# Altium footprint library 2.52-直插元件.PcbLib: 165 footprints (part 10 of 11)
Each footprint in its own frame and in the unit in brackets; x right, y up, seen from the top. Pads: shape width x height; smd on the part's side, far side on the other; paste and mask are expansions set on the pad; w line width, h text height; cw(c..) or ccw(c..) is an arc to the next point about the centre after c.
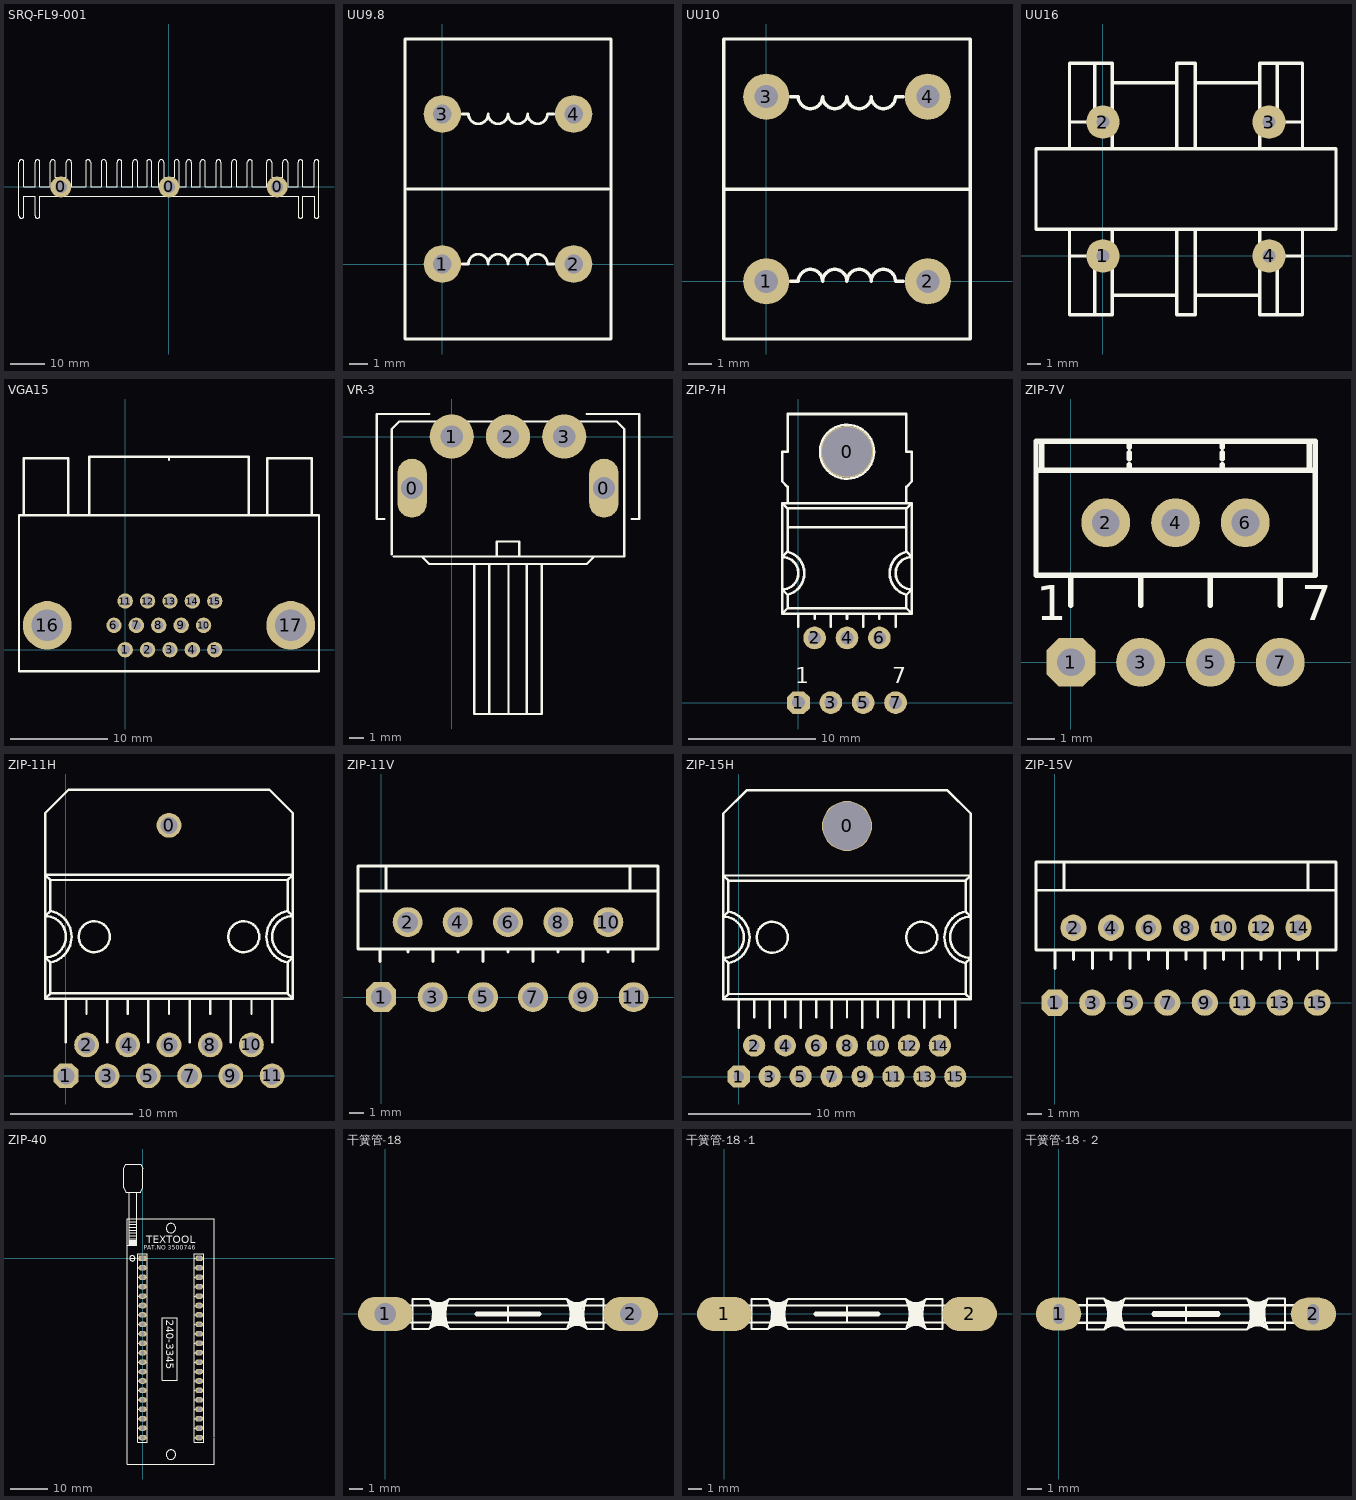
[diagram p9: the footprints below, top view; thin cyan lines are the x and y axes]

## SRQ-FL9-001 [mm] "封装库来自淘宝卖家 ID：黄晶宝石"
pads (3):
  round 6 hole 3.5: 0(-31,0) 0(0,0) 0(31,0)
Top Overlay:
  lines w0.1: -31.827,0.937 ccw(c-31,0) -30.172,0.937 ; -31.8,0.937 -31.8,2.8 -32.6,2.8 -32.6,7.1 ccw(c-33.3,7.1) -34,7.1 -34,0 -37,0 -37,7.1 ccw(c-37.7,7.1) -38.4,7.1 -38.4,0 -41.6,0 -41.6,7.1 ccw(c-42.3,7.1) -43,7.1 -43,-8.3 ccw(c-42.3,-8.3) -41.6,-8.3 -41.6,-2.7 -38.4,-2.7 -38.4,-8.3 ccw(c-37.7,-8.3) -37,-8.3 -37,-2.7 37,-2.7 37,-8.3 ccw(c37.7,-8.3) 38.4,-8.3 38.4,-2.7 41.6,-2.7 41.6,-8.3 ccw(c42.3,-8.3) 43,-8.3 43,7.1 ccw(c42.3,7.1) 41.6,7.1 41.6,0 38.4,0 38.4,7.1 ccw(c37.7,7.1) 37,7.1 37,0 34,0 34,7.1 ccw(c33.3,7.1) 32.6,7.1 32.6,2.8 31.8,2.8 31.8,0.937 ; -30.2,0.937 -30.2,2.8 -29.4,2.8 -29.4,7.1 cw(c-28.7,7.1) -28,7.1 -28,0 -23.9,0 -23.9,7.1 cw(c-23.2,7.1) -22.5,7.1 -22.5,0 -19.4,0 -19.4,7.1 cw(c-18.7,7.1) -18,7.1 -18,0 -14.9,0 -14.9,7.1 cw(c-14.2,7.1) -13.5,7.1 -13.5,0 -10.4,0 -10.4,7.1 cw(c-9.7,7.1) -9,7.1 -9,0 -6.4,0 -6.4,7.1 cw(c-5.7,7.1) -5,7.1 -5,0 -2.9,0 -2.9,7.1 cw(c-2.2,7.1) -1.5,7.1 -1.5,2.8 -0.827,2.8 -0.827,0.937 ccw(c0,0) 0.828,0.937 0.828,2.8 1.5,2.8 1.5,7.1 cw(c2.2,7.1) 2.9,7.1 2.9,0 5,0 5,7.1 cw(c5.7,7.1) 6.4,7.1 ; 6.4,7.1 6.4,0 9,0 9,7.1 cw(c9.7,7.1) 10.4,7.1 10.4,0 13.5,0 13.5,7.1 cw(c14.2,7.1) 14.9,7.1 14.9,0 18,0 18,7.1 cw(c18.7,7.1) 19.4,7.1 19.4,0 22.5,0 22.5,7.1 cw(c23.2,7.1) 23.9,7.1 23.9,0 28,0 28,7.1 cw(c28.7,7.1) 29.4,7.1 29.4,2.8 30.2,2.8 30.2,0.937 ; 30.173,0.937 ccw(c31,0) 31.828,0.937
3D body: height 33, standoff 0, extent -43,-9 43,7.8

## UU9.8 [mm]
pads (4):
  round 2 hole 1: 1(0,0) 2(7,0) 3(0,8) 4(7,8)
Top Overlay:
  lines w0.15: -2,-4 9,-4 ; -2,-3.991 -2,12 9,12 9,-3.991 ; -1.851,3.998 8.847,3.998 ; 1.045,-0.007 1.388,-0.007 cw(c1.915,-0.007) 2.442,-0.007 cw(c2.969,-0.007) 3.496,-0.007 cw(c4.023,-0.007) 4.55,-0.007 cw(c5.077,-0.007) 5.604,-0.007 5.947,-0.007 ; 1.045,8.007 1.388,8.007 ccw(c1.915,8.007) 2.442,8.007 ccw(c2.969,8.007) 3.496,8.007 ccw(c4.023,8.007) 4.55,8.007 ccw(c5.077,8.007) 5.604,8.007 5.947,8.007
3D body: height 16.04, standoff -2.96, extent -1.75,-3.746 8.75,11.755

## UU10 [mm] "淘宝ID:黄晶宝石   店铺网址:https://shop463601444.taobao.com"
pads (4):
  round 2 hole 1: 1(0,0) 2(7,0) 3(0,8) 4(7,8)
Top Overlay:
  lines w0.15: -1.851,3.998 8.847,3.998 ; -1.851,10.5 -1.847,-2.5 8.847,-2.5 8.847,10.5 -1.847,10.5 ; 1.045,-0.007 1.388,-0.007 cw(c1.915,-0.007) 2.442,-0.007 cw(c2.969,-0.007) 3.496,-0.007 cw(c4.023,-0.007) 4.55,-0.007 cw(c5.077,-0.007) 5.604,-0.007 5.947,-0.007 ; 1.045,8.007 1.388,8.007 ccw(c1.915,8.007) 2.442,8.007 ccw(c2.969,8.007) 3.496,8.007 ccw(c4.023,8.007) 4.55,8.007 ccw(c5.077,8.007) 5.604,8.007 5.947,8.007
3D body: height 15.45, standoff -3, extent -1.925,-3.782 8.925,11.782

## UU16 [mm] "封装库来自淘宝卖家 ID：黄晶宝石"
pads (4):
  round 2.5 hole 1: 1(0,0) 2(0,10) 3(12.4,10) 4(12.4,0)
Top Overlay:
  lines w0.254: -2.5,8 -2.5,9.996 ; 0.7,-2.923 5.5,-2.923 ; 0.7,2 0.7,-4.4 -0.6,-4.4 ; 0.7,8 0.7,14.4 -0.6,14.4 ; 0.7,12.923 5.5,12.923 ; 5.5,2 5.5,-4.4 6.9,-4.4 6.9,2 ; 5.5,8 5.5,14.4 6.9,14.4 6.9,8 ; 6.9,-2.923 11.7,-2.923 ; 6.9,12.923 11.7,12.923 ; 11.7,2 11.7,-4.4 13,-4.4 ; 11.7,8 11.7,14.4 13,14.4 ; -2.5,0 -2.5,0.004 ; -2.5,0 -0.6,0 -0.6,-4.4 ; -2.5,0 -2.5,0.004 ; -2.5,0 -2.5,2 -2.5,0.004 ; -2.5,0.004 -2.5,-4.4 -0.6,-4.4 ; -2.5,9.996 -2.5,14.4 -0.6,14.4 ; -2.5,9.996 -2.5,10 -0.6,10 -0.6,14.4 ; 13,-4.4 14.9,-4.4 14.9,0.004 ; 13,-4.4 13,0 14.9,0 ; 13,14.4 14.9,14.4 14.9,9.996 ; 13,14.4 13,10 14.9,10 ; 14.9,0 14.9,0.004 ; 14.9,0 14.9,0.004 ; 14.9,0 14.9,2 14.9,0.004 ; 14.9,9.996 14.9,10 ; 14.9,9.996 14.9,8 14.9,10 ; 14.9,9.996 14.9,10 ; -5,2 17.4,2 17.4,8 -5,8 -5,2
3D body: height 25.55, standoff -3.8, extent -4.917,-4.35 17.317,14.35

## VGA15 [mm]
pads (17):
  round 1.58 hole 1: 1(0,0) 2(2.3,0) 3(4.6,0) 4(6.9,0) 5(9.2,0) 6(-1.15,2.5) 7(1.15,2.5) 8(3.45,2.5) 9(5.75,2.5) 10(8.05,2.5) 11(0,5) 12(2.3,5) 13(4.6,5) 14(6.9,5) 15(9.2,5)
  round 5 hole 3.25: 16(-8,2.5) 17(17,2.5)
Top Overlay:
  lines w0.254: -10.9,-2.2 -10.9,13.8 19.9,13.8 19.9,-2.2 -10.89,-2.2 -10.9,-2.19 ; -10.4,13.8 -10.4,19.67 -5.83,19.67 -5.83,13.82 ; -3.7,13.8 -3.7,19.8 12.7,19.8 12.7,13.8 ; 4.5,19.5 4.5,19.8 ; 14.6,13.8 14.6,19.68 19.18,19.68 19.18,13.84
3D body: height 12.77, standoff -3.27, extent -11.055,-0.875 19.755,20.225

## VR-3 [mm]
pads (5):
  oval 2x4 hole 1.5: 0(-2.69,-3.5) 0(10.31,-3.5)
  round 3 hole 1.5: 1(0,0) 2(3.81,0) 3(7.62,0)
Top Overlay:
  lines w0.15: -4.572,-5.588 -5.08,-5.588 -5.08,1.524 -2.54,1.524 ; -4.572,1.524 -1.524,1.524 ; -4.064,-8 -4.064,0.508 -3.556,1.016 11.176,1.016 11.684,0.508 11.684,-8.128 -3.936,-8.128 ; -2.032,-8.128 -1.524,-8.636 9.144,-8.636 9.652,-8.128 ; 1.524,-8.636 1.524,-18.796 6.096,-18.796 6.096,-8.636 ; 2.54,-18.796 2.54,-8.636 ; 3.048,-8.128 3.048,-7.112 4.572,-7.112 4.572,-8.128 ; 3.85,-18.796 3.85,-8.636 ; 5.08,-18.796 5.08,-8.636 ; 9.144,1.524 12.7,1.524 12.7,-5.588 12.192,-5.588
Keep-Out Layer:
  lines w0.15: -2.692,-4.521 -2.692,-2.489 ; 10.308,-4.521 10.308,-2.489
3D body: height 30, standoff -5, extent -6.29,-16.653 11.71,4.347

## ZIP-7H [mil]
pads (8):
  round 161.65 hole 154.17: 0(150,775)
  oct 70x70 hole 40: 1(0,0)
  round 70 hole 40: 2(50,200) 3(100,0) 4(150,200) 5(200,0) 6(250,200) 7(300,0)
Top Overlay:
  circle w8: c150,775 r83.33
  lines w7.87: -50,350 -33.33,333.33 -33.33,291.67 ; -50,450 -33.33,466.67 -33.33,600 ; -33.33,541.67 333.33,541.67 ; -33.33,616.67 -33.33,666.67 -50,683.33 -50,775 -33.33,775 -33.33,891.67 333.33,891.67 333.33,775 350,775 350,683.33 333.33,666.67 333.33,616.67 ; 0,234.46 0,275 ; 50,259.06 50,275 ; 100,234.25 100,275 ; 150,259.06 150,275 ; 200,234.25 200,275 ; 250,259.06 250,275 ; 300,234.25 300,275 ; 350,350 333.33,333.33 333.33,291.67 ; 350,450 333.33,466.67 333.33,600 ; -50,275 -33.33,291.67 ; -50,275 -50,616.67 ; -50,275 350,275 ; -50,616.67 -33.33,600 ; -50,616.67 350,616.67 ; -33.33,291.67 333.33,291.67 ; -33.33,600 333.33,600 ; 333.33,291.67 350,275 ; 333.33,600 350,616.67 ; 350,275 350,616.67
  lines w8: -50,350 ccw(c-50,400) -50,450 ; -33.47,333.7 ccw(c-50,400) -33.47,466.3 ; 333.47,333.7 cw(c350,400) 333.47,466.3 ; 350,350 cw(c350,400) 350,450
  text "7" at 290,60 h50
  text "1" at -10,60 h50

## ZIP-7V [mil]
pads (7):
  oct 70x70 hole 40: 1(0,0)
  round 70 hole 40: 2(50,200) 3(100,0) 4(150,200) 5(200,0) 6(250,200) 7(300,0)
Top Overlay:
  lines w7.87: -50,275 350,275 ; -41.67,275 -41.67,316.67 ; 0,81.89 0,125 ; 83.33,275 83.33,283.33 ; 83.33,291.67 83.33,300 ; 83.33,308.33 83.33,316.67 ; 100,81.89 100,125 ; 200,81.89 200,125 ; 216.67,275 216.67,283.33 ; 216.67,291.67 216.67,300 ; 216.67,308.33 216.67,316.67 ; 300,81.89 300,125 ; 341.67,275 341.67,316.67 ; -50,125 -50,316.67 350,316.67 350,125 -50,125
  text "1" at -50,60 h50
  text "7" at 330,60 h50

## ZIP-11H [mil]
pads (12):
  round 80 hole 55: 0(333.33,810) 2(66.67,100) 3(133.33,0) 4(200,100) 5(266.67,0) 6(333.33,100) 7(400,0) 8(466.67,100) 9(533.33,0) 10(600,100) 11(666.67,0)
  oct 80x80 hole 55: 1(0,0)
Top Overlay:
  circle w8: c575,450 r50
  circle w8: c91.67,450 r50
  lines w7.87: -66.67,383.33 -50,366.67 -50,266.67 ; -66.67,516.67 -50,533.33 -50,633.33 ; 0,108.33 0,250 ; 66.67,200 66.67,250 ; 133.33,108.33 133.33,250 ; 200,200 200,250 ; 266.67,108.33 266.67,250 ; 333.33,200 333.33,250 ; 400,108.33 400,250 ; 466.67,200 466.67,250 ; 533.33,108.33 533.33,250 ; 600,200 600,250 ; 666.67,108.33 666.67,250 ; 733.33,383.33 716.67,366.67 716.67,266.67 ; 733.33,516.67 716.67,533.33 716.67,633.33 ; -66.67,250 -50,266.67 ; -66.67,250 733.33,250 ; -66.67,250 -66.67,650 ; -66.67,650 -50,633.33 ; -66.67,650 733.33,650 ; -66.67,650 -66.67,850 8.33,925 658.33,925 733.33,850 733.33,650 ; -50,266.67 716.67,266.67 ; -50,633.33 716.67,633.33 ; 716.67,266.67 733.33,250 ; 716.67,633.33 733.33,650 ; 733.33,250 733.33,650
  lines w8: -66.67,383.33 ccw(c-66.67,450) -66.67,516.67 ; -50.45,366.56 ccw(c-66.67,450) -50.45,533.44 ; 717.11,366.56 cw(c733.33,450) 717.11,533.44 ; 733.33,383.33 cw(c733.33,450) 733.33,516.67

## ZIP-11V [mil]
pads (11):
  oct 80x80 hole 55: 1(0,0)
  round 80 hole 55: 2(70.83,200) 3(137.5,0) 4(204.17,200) 5(271.67,0) 6(338.33,200) 7(405,0) 8(472.5,200) 9(539.17,0) 10(605.83,200) 11(673.33,0)
Top Overlay:
  lines w7.87: -3.33,94.89 -3.33,128.23 ; 13.33,283.33 13.33,350 ; 71.67,119.89 71.67,128.23 ; 138.33,94.89 138.33,128.23 ; 205,119.89 205,128.23 ; 271.67,94.89 271.67,128.23 ; 338.33,119.89 338.33,128.23 ; 405,94.89 405,128.23 ; 471.67,119.89 471.67,128.23 ; 538.33,94.89 538.33,128.23 ; 605,119.89 605,128.23 ; 663.33,283.33 663.33,350 ; 671.67,94.89 671.67,128.23 ; -61.67,283.33 -61.67,128.23 738.33,128.23 738.33,283.33 ; -61.67,283.33 738.33,283.33 ; -61.67,283.33 -61.67,350 738.33,350 738.33,283.33

## ZIP-15H [mil]
pads (16):
  round 161.67 hole 154.17: 0(350,810)
  oct 71.67x71.67 hole 35: 1(0,0)
  round 71.67 hole 35: 2(50,100) 3(100,0) 5(200,0) 6(250,100) 7(300,0) 8(350,100) 9(400,0) 10(450,100) 11(500,0) 12(550,100) 13(600,0) 14(650,100) 15(700,0)
  round 70 hole 40: 4(150,100)
Top Overlay:
  circle w8: c108.33,450 r50
  circle w8: c591.67,450 r50
  lines w7.87: -50,383.33 -33.33,366.67 -33.33,266.67 ; -50,516.67 -33.33,533.33 -33.33,633.33 ; 0,157.48 0,250 ; 50,191.67 50,250 ; 100,157.48 100,250 ; 150,191.67 150,250 ; 200,157.48 200,250 ; 250,191.67 250,250 ; 300,157.48 300,250 ; 350,191.67 350,250 ; 400,157.48 400,250 ; 450,191.67 450,250 ; 500,157.48 500,250 ; 550,191.67 550,250 ; 600,157.48 600,250 ; 650,191.67 650,250 ; 700,157.48 700,250 ; 750,383.33 733.33,366.67 733.33,266.67 ; 750,516.67 733.33,533.33 733.33,633.33 ; -50,250 -50,650 ; -50,250 750,250 ; -50,250 -33.33,266.67 ; -50,650 -50,850 25,925 675,925 750,850 750,650 ; -50,650 750,650 ; -50,650 -33.33,633.33 ; -33.33,266.67 733.33,266.67 ; -33.33,633.33 733.33,633.33 ; 733.33,266.67 750,250 ; 733.33,633.33 750,650 ; 750,250 750,650
  lines w8: -50,383.33 ccw(c-50,450) -50,516.67 ; -33.78,366.56 ccw(c-50,450) -33.78,533.44 ; 733.78,366.56 cw(c750,450) 733.78,533.44 ; 750,383.33 cw(c750,450) 750,516.67

## ZIP-15V [mil] "淘宝ID:黄晶宝石"
pads (15):
  oct 70x70 hole 40: 1(0,0)
  round 70 hole 40: 2(50,200) 3(100,0) 4(150,200) 5(200,0) 6(250,200) 7(300,0) 8(350,200) 9(400,0) 10(450,200) 11(500,0) 12(550,200) 13(600,0) 14(650,200) 15(700,0)
Top Overlay:
  lines w7.87: -50.16,140.91 -50,283.33 -50,375 750,375 750,300 ; -50,140.91 750,140.91 750,300 ; -50,300 750,300 ; 0,90.91 0,140.91 ; 25,300 25,375 ; 50,115.91 50,140.91 ; 100,90.91 100,140.91 ; 150,115.91 150,140.91 ; 200,90.91 200,140.91 ; 250,115.91 250,140.91 ; 300,90.91 300,140.91 ; 350,115.91 350,140.91 ; 400,90.91 400,140.91 ; 450,115.91 450,140.91 ; 500,90.91 500,140.91 ; 550,115.91 550,140.91 ; 600,90.91 600,140.91 ; 650,115.91 650,140.91 ; 675,300 675,375 ; 700,90.91 700,140.91

## ZIP-40 [mil]
pads (40):
  rect 85x59.06 hole 45: 1(0,0)
  oval 85x59.06 hole 45: 2(0,-100) 3(0,-200) 4(0,-300) 5(0,-400) 6(0,-500) 7(0,-600) 8(0,-700) 9(0,-800) 10(0,-900) 11(0,-1000) 12(0,-1100) 13(0,-1200) 14(0,-1300) 15(0,-1400) 16(0,-1500) 17(0,-1600) 18(0,-1700) 19(0,-1800) 20(0,-1900) 21(600,-1900) 22(600,-1800) 23(600,-1700) 24(600,-1600) 25(600,-1500) 26(600,-1400) 27(600,-1300) 28(600,-1200) 29(600,-1100) 30(600,-1000) 31(600,-900) 32(600,-800) 33(600,-700) 34(600,-600) 35(600,-500) 36(600,-400) 37(600,-300) 38(600,-200) 39(600,-100) 40(600,0)
Top Overlay:
  circle w7: c-108.28,0 r28.28
  circle w7: c300,320 r50
  circle w7: c300,-2080 r50
  lines w10: -160,140 -60,140 -60,420 -60,700 ; -140,140 -140,190 -60,190 ; -140,160 -60,160 ; -140,170 -60,170 ; -140,180 -60,180 ; -140,210 -60,210 ; -140,240 -60,240 ; -140,270 -60,270 ; -140,300 -60,300 ; -140,330 -60,330 ; -140,360 -60,360 ; -140,390 -60,390 ; -130,0 -80,0 ; -60,150 -140,150 -140,420 -140,700 ; -50,-1900 50,-1900 ; -50,-1800 50,-1800 ; -50,-1700 50,-1700 ; -50,-1600 50,-1600 ; -50,-1500 50,-1500 ; -50,-1400 50,-1400 ; -50,-1300 50,-1300 ; -50,-1200 50,-1200 ; -50,-1100 50,-1100 ; -50,-1000 50,-1000 ; -50,-900 50,-900 ; -50,-800 50,-800 ; -50,-700 50,-700 ; -50,-600 50,-600 ; -50,-500 50,-500 ; -50,-400 50,-400 ; -50,-300 50,-300 50,-320 ; -50,-200 50,-200 ; -50,-100 50,-100 ; -50,0 50,0 ; 550,-1900 650,-1900 ; 550,-1800 650,-1800 ; 550,-1700 650,-1700 ; 550,-1600 650,-1600 ; 550,-1500 650,-1500 ; 550,-1400 650,-1400 ; 550,-1300 650,-1300 ; 550,-1200 650,-1200 ; 550,-1100 650,-1100 ; 550,-1000 650,-1000 ; 550,-900 650,-900 ; 550,-800 650,-800 ; 550,-700 650,-700 ; 550,-600 650,-600 ; 550,-500 640,-500 650,-500 ; 550,-400 650,-400 ; 550,-300 650,-300 ; 550,-200 650,-200 ; 550,-100 650,-100 ; 550,0 650,0 ; 760,-1900 760,-2180 -160,-2180 -160,420 760,420 760,-1890 ; -140,700 -180,700 -200,750 -200,950 -180,1000 -20,1000 0,950 0,750 -20,700 -60,700 ; -140,700 -60,700 ; -50,-1950 -50,50 50,50 50,-1950 -50,-1950 ; 210,-1290 370,-1290 370,-630 210,-630 210,-1290 ; 550,-1950 550,50 650,50 650,-1950 550,-1950
  text "TEXTOOL" at 40,160 h80
  text "240-3345" at 250,-650 h80
  text "PAT.NO 3500746" at 10,90 h47.24
3D body: height 524.68, standoff -120.98, extent -220,-2157.05 738.58,961.05

## 干簧管-18 [mm]
pads (2):
  oval 4x2.5 hole 1.6: 1(0,0) 2(18,0)
Top Overlay:
  lines w0.15: 0.8,-0.62 0.8,0.61 ; 1.1,-0.62 1.1,0.62 ; 1.99,0.62 3.4,0.62 ; 3.2,-1.1 2,-1.1 2,-0.62 ; 3.208,-1.102 cw(c3.96,-1.93) 4.71,-1.1 13.3,-1.1 ; 3.208,1.098 cw(c1.19,-0.01) 3.215,-1.105 ; 3.41,-0.62 2,-0.62 ; 4.49,-0.62 13.5,-0.62 ; 4.49,0.62 13.49,0.62 ; 4.685,1.105 ccw(c6.71,0.01) 4.692,-1.098 ; 4.702,1.102 cw(c3.95,1.93) 3.2,1.1 2,1.1 2,0.62 ; 4.707,1.098 13.298,1.098 ccw(c14.048,1.928) 14.8,1.1 16,1.1 ; 9,-0.62 9,0.62 ; 13.298,1.098 cw(c11.28,-0.01) 13.305,-1.105 cw(c14.058,-1.932) 14.808,-1.102 15.998,-1.102 15.998,1.098 ; 14.61,0.62 16,0.62 ; 14.62,-0.62 16.01,-0.62 ; 14.805,1.105 ccw(c16.83,0.01) 14.812,-1.098 ; 16.9,-0.62 16.9,0.61 ; 17.2,-0.62 17.2,0.61 ; 2,-0.62 2,0 2,0.62 ; 2,-0.62 0,-0.62 -0.5,-0.62 -0.5,0.62 0,0.62 2,0.62 ; 16,0.62 16,0 16,-0.62 18,-0.62 18.5,-0.62 18.5,0.62 18,0.62 16,0.62
  lines w0.254: 3.42,-0.74 4.44,-0.74 ; 3.42,0.74 4.43,0.74 ; 3.48,0.53 4.37,0.53 ; 3.49,-0.56 4.37,-0.56 ; 3.51,0.31 4.37,0.31 ; 3.52,-0.36 4.32,-0.36 ; 3.53,-0.15 4.28,-0.15 ; 3.54,0.09 4.3,0.09 ; 13.5,0.75 14.57,0.75 ; 13.52,-0.76 14.56,-0.76 ; 13.53,-0.72 14.46,-0.72 ; 13.57,0.52 14.49,0.52 ; 13.58,-0.55 14.43,-0.55 ; 13.62,-0.38 14.4,-0.38 ; 13.63,0.29 14.42,0.29 ; 13.64,-0.17 14.44,-0.17 ; 13.65,0.05 14.42,0.05
  lines w0.4: 6.75,0 11.25,0

## 干簧管-18 -1 [mm]
pads (2):
  oval 4x2.5 smd: 1(0,0) 2(18,0)
Top Overlay:
  lines w0.15: 0.8,-0.62 0.8,0.61 ; 1.1,-0.62 1.1,0.62 ; 1.99,0.62 3.4,0.62 ; 3.2,-1.1 2,-1.1 2,-0.62 ; 3.208,-1.102 cw(c3.96,-1.93) 4.71,-1.1 13.3,-1.1 ; 3.208,1.098 cw(c1.19,-0.01) 3.215,-1.105 ; 3.41,-0.62 2,-0.62 ; 4.49,-0.62 13.5,-0.62 ; 4.49,0.62 13.49,0.62 ; 4.685,1.105 ccw(c6.71,0.01) 4.692,-1.098 ; 4.702,1.102 cw(c3.95,1.93) 3.2,1.1 2,1.1 2,0.62 ; 4.707,1.098 13.298,1.098 ccw(c14.048,1.928) 14.8,1.1 16,1.1 ; 9,-0.62 9,0.62 ; 13.298,1.098 cw(c11.28,-0.01) 13.305,-1.105 cw(c14.058,-1.932) 14.808,-1.102 15.998,-1.102 15.998,1.098 ; 14.61,0.62 16,0.62 ; 14.62,-0.62 16.01,-0.62 ; 14.805,1.105 ccw(c16.83,0.01) 14.812,-1.098 ; 16.9,-0.62 16.9,0.61 ; 17.2,-0.62 17.2,0.61 ; 2,-0.62 2,0 2,0.62 ; 2,-0.62 0,-0.62 -0.5,-0.62 -0.5,0.62 0,0.62 2,0.62 ; 16,0.62 16,0 16,-0.62 18,-0.62 18.5,-0.62 18.5,0.62 18,0.62 16,0.62
  lines w0.254: 3.42,-0.74 4.44,-0.74 ; 3.42,0.74 4.43,0.74 ; 3.48,0.53 4.37,0.53 ; 3.49,-0.56 4.37,-0.56 ; 3.51,0.31 4.37,0.31 ; 3.52,-0.36 4.32,-0.36 ; 3.53,-0.15 4.28,-0.15 ; 3.54,0.09 4.3,0.09 ; 13.5,0.75 14.57,0.75 ; 13.52,-0.76 14.56,-0.76 ; 13.53,-0.72 14.46,-0.72 ; 13.57,0.52 14.49,0.52 ; 13.58,-0.55 14.43,-0.55 ; 13.62,-0.38 14.4,-0.38 ; 13.63,0.29 14.42,0.29 ; 13.64,-0.17 14.44,-0.17 ; 13.65,0.05 14.42,0.05
  lines w0.4: 6.75,0 11.25,0

## 干簧管-18 - 2 [mm]
pads (14):
  oval 3.2x2.3 hole 0.8: 1(0,0) 2(18,0)
  round 0.8 hole 0.8: ""(0,-0.3) ""(0,-0.3) ""(0,-0.2) ""(0,0.05) ""(0,0.25) ""(0,0.3) ""(18,-0.35) ""(18,-0.3) ""(18,-0.2) ""(18,0.05) ""(18,0.25) ""(18,0.3)
Top Overlay:
  lines w0.15: 0.8,-0.62 0.8,0.61 ; 1.1,-0.62 1.1,0.62 ; 1.99,0.62 3.4,0.62 ; 3.2,-1.1 2,-1.1 2,-0.62 ; 3.208,-1.102 cw(c3.96,-1.93) 4.71,-1.1 13.3,-1.1 ; 3.208,1.098 cw(c1.19,-0.01) 3.215,-1.105 ; 3.41,-0.62 2,-0.62 ; 4.49,-0.62 13.5,-0.62 ; 4.49,0.62 13.49,0.62 ; 4.685,1.105 ccw(c6.71,0.01) 4.692,-1.098 ; 4.702,1.102 cw(c3.95,1.93) 3.2,1.1 2,1.1 2,0.62 ; 4.707,1.098 13.298,1.098 ccw(c14.048,1.928) 14.8,1.1 16,1.1 ; 9,-0.62 9,0.62 ; 13.298,1.098 cw(c11.28,-0.01) 13.305,-1.105 cw(c14.058,-1.932) 14.808,-1.102 15.998,-1.102 15.998,1.098 ; 14.61,0.62 16,0.62 ; 14.62,-0.62 16.01,-0.62 ; 14.805,1.105 ccw(c16.83,0.01) 14.812,-1.098 ; 16.9,-0.62 16.9,0.61 ; 17.2,-0.62 17.2,0.61 ; 2,-0.62 2,0 2,0.62 ; 2,-0.62 0,-0.62 -0.5,-0.62 -0.5,0.62 0,0.62 2,0.62 ; 16,0.62 16,0 16,-0.62 18,-0.62 18.5,-0.62 18.5,0.62 18,0.62 16,0.62
  lines w0.254: 3.42,-0.74 4.44,-0.74 ; 3.42,0.74 4.43,0.74 ; 3.48,0.53 4.37,0.53 ; 3.49,-0.56 4.37,-0.56 ; 3.51,0.31 4.37,0.31 ; 3.52,-0.36 4.32,-0.36 ; 3.53,-0.15 4.28,-0.15 ; 3.54,0.09 4.3,0.09 ; 13.5,0.75 14.57,0.75 ; 13.52,-0.76 14.56,-0.76 ; 13.53,-0.72 14.46,-0.72 ; 13.57,0.52 14.49,0.52 ; 13.58,-0.55 14.43,-0.55 ; 13.62,-0.38 14.4,-0.38 ; 13.63,0.29 14.42,0.29 ; 13.64,-0.17 14.44,-0.17 ; 13.65,0.05 14.42,0.05
  lines w0.4: 6.75,0 11.25,0